# Altium footprint library DipComponent.PcbLib: 303 footprints (part 18 of 19)
Each footprint in its own frame and in the unit in brackets; x right, y up, seen from the top. Pads: shape width x height; smd on the part's side, far side on the other; paste and mask are expansions set on the pad; w line width, h text height; cw(c..) or ccw(c..) is an arc to the next point about the centre after c.
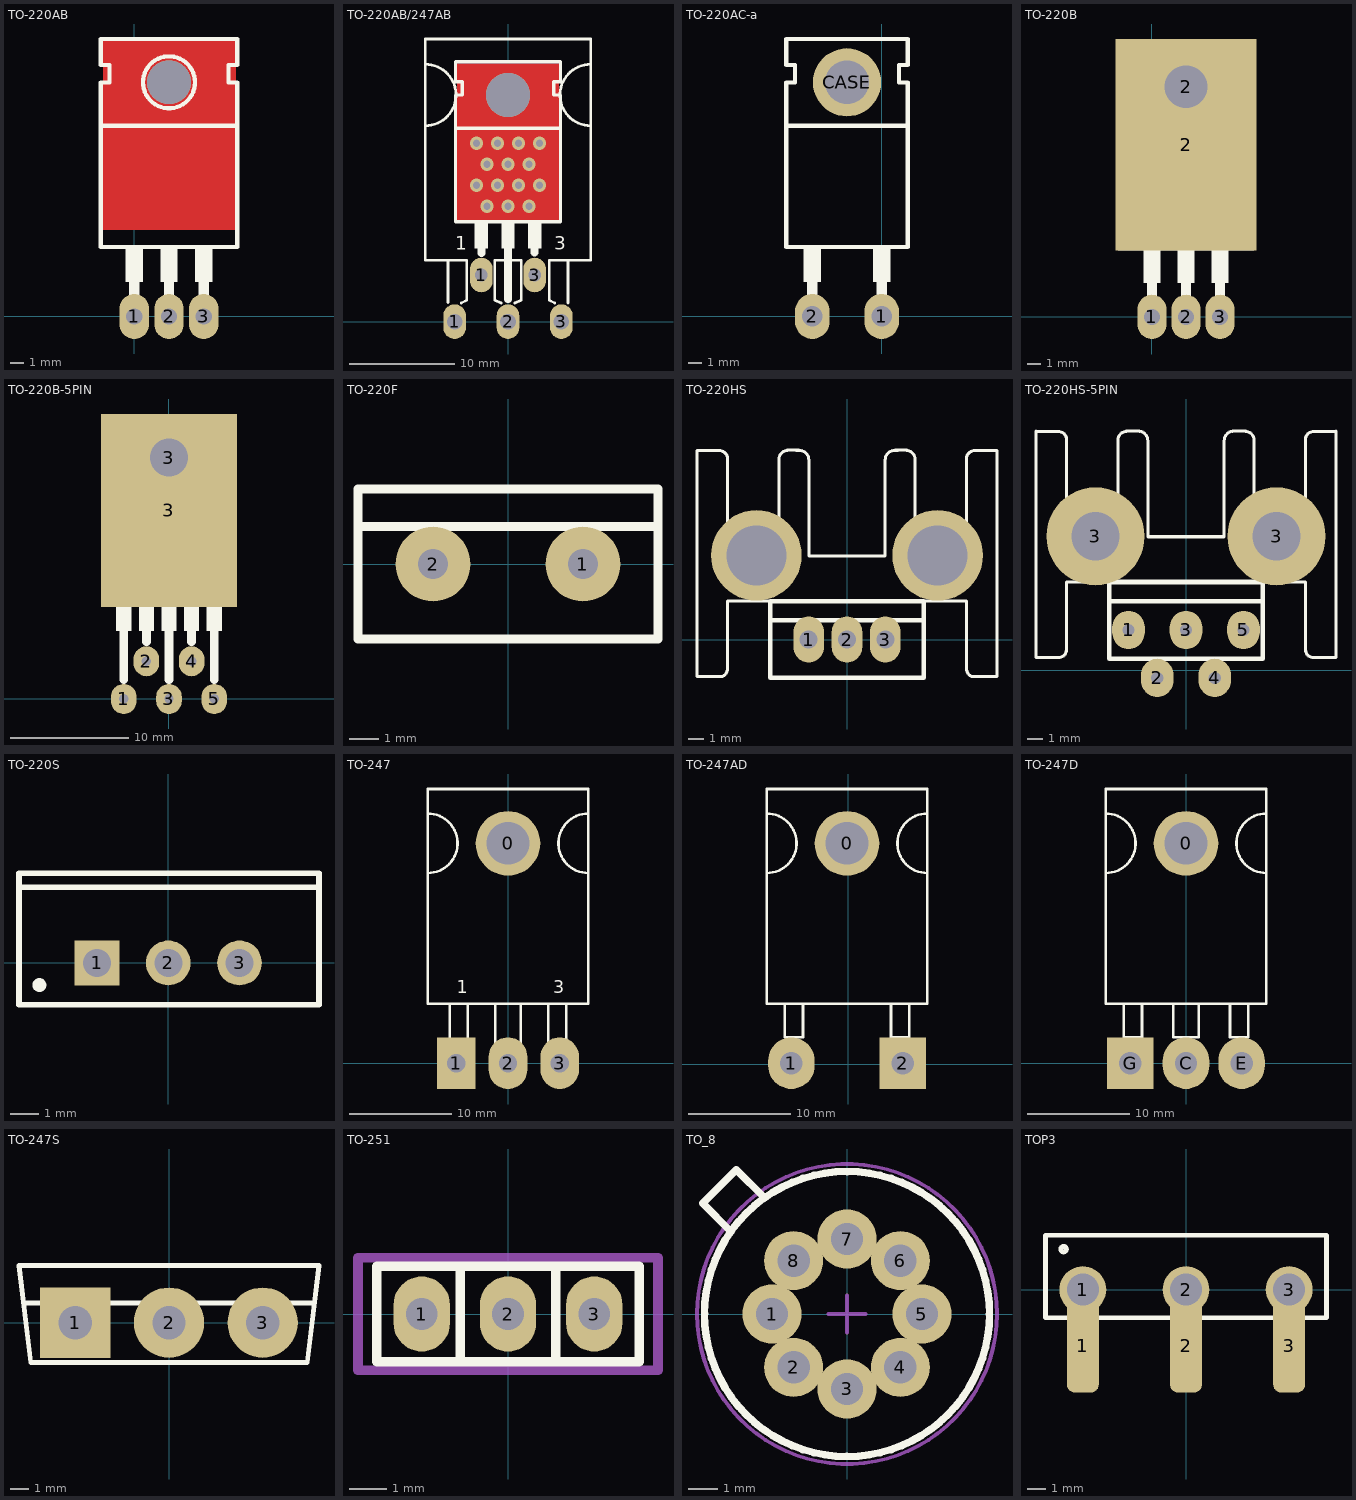
[diagram p17: the footprints below, top view; thin cyan lines are the x and y axes]

## TO-220AB [mil]
pads (3):
  oval 85x130 hole 47.24: 1(0,0) 2(100,0) 3(200,0)
via 100,675 diameter 125.98 hole 125.98
Top Layer:
  rectangle: -91,250 293,794
Top Overlay:
  circle w12: c100,675 r75
  rectangle: -25,99.97 25,199.97
  rectangle: 75,99.97 125,199.97
  rectangle: 175,99.97 225,199.97
  lines w12: -96.85,550 296.85,550 ; -96.85,800 -96.85,725 -71.85,725 -71.85,675 -96.85,675 -96.85,200 296.85,200 296.85,675 271.85,675 271.85,725 296.85,725 296.85,800
  lines w12.01: -96.85,800 296.85,800
  lines w29.53: 0,0 0,100 ; 100,0 100,100 ; 200,0 200,100
3D body "User Library-TO220-AB-H PCB.step": height 179.13, standoff -140.94, extent -95.77,-4.88 294,790.88

## TO-220AB/247AB [mil]
pads (5):
  oval 85x130 hole 59.06: 1(-200,0) 2(0,0) 3(200,0)
  oval 85x130 hole 47.24: 1(-100,175) 3(100,175)
via 0,850 diameter 165.35 hole 165.35
via 0,433.07 diameter 50 hole 28
via 78.74,433.07 diameter 50 hole 28
via -78.74,433.07 diameter 50 hole 28
via 118.11,511.81 diameter 50 hole 28
via 39.37,511.81 diameter 50 hole 28
via -39.37,511.81 diameter 50 hole 28
via -118.11,511.81 diameter 50 hole 28
via 78.74,590.55 diameter 50 hole 28
via 0,590.55 diameter 50 hole 28
via -78.74,590.55 diameter 50 hole 28
via 118.11,669.29 diameter 50 hole 28
via 39.37,669.29 diameter 50 hole 28
via -39.37,669.29 diameter 50 hole 28
via -118.11,669.29 diameter 50 hole 28
Top Layer:
  rectangle: -191,381 191,969
Bottom Layer:
  rectangle: -191,381 191,969
Top Overlay:
  circle w12: c0,850 r75
  rectangle: 75,274.97 125,374.97
  rectangle: -25,274.97 25,374.97
  rectangle: -125,274.97 -75,374.97
  lines w10: -310,735 ccw(c-310,850) -310,965 ; -225,72 -225,230 ; -175,70 -155,80 -155,230 -225,230 ; -25,70 -50,80 -50,230 50,230 50,80 25,70 ; 175,70 155,80 155,230 310,230 310,1060 -310,1060 -310,230 -225,230 ; 225,70 225,230 ; 310,735 cw(c310,850) 310,965
  lines w12: -196.85,725 196.85,725 ; -196.85,975 -196.85,900 -171.85,900 -171.85,850 -196.85,850 -196.85,375 196.85,375 196.85,850 171.85,850 171.85,900 196.85,900 196.85,975
  lines w12.01: -196.85,975 196.85,975
  lines w29.53: -100,257 -100,275 ; 0,84 0,275 ; 100,259 100,275
  text "3" at 174,270 h50
  text "1" at -198,270 h50
3D body "TO-247_bent_leads.step": height 212.6, standoff -259.84, extent -313,-1.14 312.98,1061.14

## TO-220AC-a [mm]
pads (3):
  oval 2.54x3.302 hole 1.5: 1(0,0) 2(-5.08,0)
  round 5 hole 3.2: CASE(-2.54,17.145)
Top Overlay:
  circle w0.305: c-2.54,17.145 r1.905
  rectangle: -5.715,2.54 -4.445,5.08
  rectangle: -0.635,2.54 0.635,5.08
  lines w0.305: -6.985,13.97 1.905,13.97 ; -6.985,5.08 1.905,5.08 1.905,17.145 1.27,17.145 1.27,18.415 1.905,18.415 1.905,20.32 -6.985,20.32 -6.985,18.415 -6.35,18.415 -6.35,17.145 -6.985,17.145 -6.985,5.08
  lines w0.75: -5.08,0 -5.08,2.54 ; 0,0 0,2.54

## TO-220B [mil]
height 53.15
pads (5):
  oval 85x130 hole 47.24: 1(0,0) 2(100,0) 3(200,0)
  rect 415x620 smd: 2(100,505)
  round 196.85 hole 125.98: 2(100,675)
Top Overlay:
  circle w12: c100,675 r75
  rectangle: 175,100 225,200
  rectangle: 75,100 125,200
  rectangle: -25,100 25,200
  lines w12: -96.85,550 296.85,550 ; -96.85,800 -96.85,725 -71.85,725 -71.85,675 -96.85,675 -96.85,200 296.85,200 296.85,675 271.85,675 271.85,725 296.85,725 296.85,800
  lines w12.01: -96.85,800 296.85,800
  lines w29.53: 0,0 0,100 ; 100,0 100,100 ; 200,0 200,100

## TO-220B-5PIN [mm]
pads (7):
  oval 2.159x2.54 hole 0.8: 1(-3.804,0.005) 2(-1.899,3.18) 3(0.006,0.005) 4(1.911,3.18) 5(3.816,0.005)
  rect 11.43x16.256 smd: 3(0.006,15.88)
  round 5 hole 3.2: 3(0.006,20.325)
Top Overlay:
  circle w0.305: c0.006,20.325 r1.905
  rectangle: -2.534,5.72 -1.264,8.26
  rectangle: -0.629,5.72 0.641,8.26
  rectangle: 1.276,5.72 2.546,8.26
  rectangle: -4.439,5.72 -3.169,8.26
  rectangle: 3.181,5.72 4.451,8.26
  lines w0.305: -4.439,17.15 4.451,17.15 ; -4.439,8.26 4.451,8.26 4.451,20.325 3.816,20.325 3.816,21.595 4.451,21.595 4.451,23.5 -4.439,23.5 -4.439,21.595 -3.804,21.595 -3.804,20.325 -4.439,20.325 -4.439,8.26
  lines w0.75: -3.804,1.656 -3.804,5.72 ; -1.899,4.831 -1.899,5.72 ; 0.006,1.656 0.006,5.72 ; 1.911,4.831 1.911,5.72 ; 3.816,1.656 3.816,5.72

## TO-220F [mm]
pads (2):
  round 2.54 hole 1: 1(2.54,0) 2(-2.54,0)
Top Overlay:
  lines w0.305: -5.08,1.27 5.08,1.27 ; -5.08,-2.54 -5.08,2.54 5.08,2.54 5.08,-2.54 -5.08,-2.54

## TO-220HS [mm]
pads (5):
  oval 2.032x3.048 hole 1.2: 1(-2.54,0) 2(0,0) 3(2.54,0)
  round 6 hole 4: ""(-6,5.57) ""(6,5.57)
Top Overlay:
  lines w0.203: -9.94,12.52 -8.46,12.52 cw(c-8.46,11.97) -7.91,11.97 -7.91,7.54 ; -9.94,12.54 -9.94,-2.46 -8.42,-2.46 ccw(c-8.42,-1.97) -7.93,-1.97 -7.93,2.54 0.06,2.54 ; -7.91,7.55 ccw(c-7.51,7.55) -7.51,7.15 -7.23,7.15 cw(c-7.23,6.86) -6.94,6.86 cw(c-7.28,6.86) -7.28,6.52 ; -7.349,6.521 ccw(c-6.2,5.59) -5.051,6.521 ; -5.16,6.53 -5.07,6.53 ; -5.13,6.52 cw(c-5.13,6.86) -5.47,6.86 cw(c-5.18,6.86) -5.18,7.15 -4.9,7.15 ccw(c-4.9,7.55) -4.5,7.55 ; -4.5,7.54 -4.5,11.97 cw(c-3.95,11.97) -3.95,12.52 ; -3.96,12.55 -3.18,12.55 ; -3.37,12.54 -3.17,12.54 cw(c-3.17,11.9) -2.53,11.9 -2.53,5.54 ; -2.52,5.54 0.06,5.54 ; -0.06,2.54 7.93,2.54 7.93,-1.97 ccw(c8.42,-1.97) 8.42,-2.46 9.94,-2.46 9.94,12.54 ; -0.06,5.54 2.53,5.54 2.53,11.9 cw(c3.17,11.9) 3.17,12.54 3.37,12.54 ; 3.18,12.55 3.96,12.55 ; 3.95,12.52 cw(c3.95,11.97) 4.5,11.97 4.5,7.54 ; 4.5,7.55 ccw(c4.9,7.55) 4.9,7.15 5.18,7.15 cw(c5.18,6.86) 5.47,6.86 cw(c5.13,6.86) 5.13,6.52 ; 5.031,6.511 ccw(c6.21,5.59) 7.373,6.532 ; 5.03,6.53 5.21,6.53 ; 7.21,6.54 7.37,6.54 ; 7.28,6.52 cw(c7.28,6.86) 6.94,6.86 cw(c7.23,6.86) 7.23,7.15 7.51,7.15 ccw(c7.51,7.55) 7.91,7.55 ; 7.91,7.54 7.91,11.97 cw(c8.46,11.97) 8.46,12.52 9.94,12.52
  lines w0.305: -5.08,1.27 5.08,1.27 ; -5.08,-2.54 5.08,-2.54 5.08,2.54 -5.08,2.54 -5.08,-2.54

## TO-220HS-5PIN [mm]
pads (7):
  oval 2.159x2.54 hole 0.8: 1(-3.81,2.667) 2(-1.905,-0.508) 3(0,2.667) 4(1.905,-0.508) 5(3.81,2.667)
  round 6.5 hole 3.2: 3(-6,8.872) 3(6,8.872)
Top Overlay:
  lines w0.203: -9.94,15.822 -8.46,15.822 cw(c-8.46,15.272) -7.91,15.272 -7.91,10.842 ; -9.94,15.842 -9.94,0.842 -8.42,0.842 ccw(c-8.42,1.332) -7.93,1.332 -7.93,5.842 0.06,5.842 ; -7.91,10.852 ccw(c-7.51,10.852) -7.51,10.452 -7.23,10.452 cw(c-7.23,10.162) -6.94,10.162 cw(c-7.28,10.162) -7.28,9.822 ; -7.349,9.823 ccw(c-6.2,8.892) -5.051,9.823 ; -5.16,9.832 -5.07,9.832 ; -5.13,9.822 cw(c-5.13,10.162) -5.47,10.162 cw(c-5.18,10.162) -5.18,10.452 -4.9,10.452 ccw(c-4.9,10.852) -4.5,10.852 ; -4.5,10.842 -4.5,15.272 cw(c-3.95,15.272) -3.95,15.822 ; -3.96,15.852 -3.18,15.852 ; -3.37,15.842 -3.17,15.842 cw(c-3.17,15.202) -2.53,15.202 -2.53,8.842 ; -2.52,8.842 0.06,8.842 ; -0.06,5.842 7.93,5.842 7.93,1.332 ccw(c8.42,1.332) 8.42,0.842 9.94,0.842 9.94,15.842 ; -0.06,8.842 2.53,8.842 2.53,15.202 cw(c3.17,15.202) 3.17,15.842 3.37,15.842 ; 3.18,15.852 3.96,15.852 ; 3.95,15.822 cw(c3.95,15.272) 4.5,15.272 4.5,10.842 ; 4.5,10.852 ccw(c4.9,10.852) 4.9,10.452 5.18,10.452 cw(c5.18,10.162) 5.47,10.162 cw(c5.13,10.162) 5.13,9.822 ; 5.031,9.813 ccw(c6.21,8.892) 7.373,9.834 ; 5.03,9.832 5.21,9.832 ; 7.21,9.842 7.37,9.842 ; 7.28,9.822 cw(c7.28,10.162) 6.94,10.162 cw(c7.23,10.162) 7.23,10.452 7.51,10.452 ccw(c7.51,10.852) 7.91,10.852 ; 7.91,10.842 7.91,15.272 cw(c8.46,15.272) 8.46,15.822 9.94,15.822
  lines w0.305: -5.08,4.572 5.08,4.572 ; -5.08,0.762 -4.826,0.762 4.826,0.762 5.08,0.762 5.08,5.842 -5.08,5.842 -5.08,0.762

## TO-220S [mm] "TO, Thru-Hole, Vertical, Heatsink Mounted; 3 In-Line Leads; Pitch 2.54 mm"
height 19.3
pads (3):
  rect 1.6x1.6 hole 1: 1(-2.54,0)
  round 1.6 hole 1: 2(0,0) 3(2.54,0)
Top Overlay:
  circle w0.25: c-4.597,-0.787 r0.125
  lines w0.2: -5.325,2.706 5.375,2.706 ; -5.325,-1.494 -5.325,3.206 5.375,3.206 5.375,-1.494 -5.325,-1.494
Mechanical 15:
  lines w0.1: -0.5,0 0.5,0 ; 0,-0.5 0,0.5
3D body "User Library-TO220AB.step": height 21.33, standoff -8, extent -5.606,-1.495 5.607,3.195

## TO-247 [mm]
pads (4):
  round 6.35 hole 4.2: 0(0,21.59)
  rect 3.81x5.08 hole 1.8: 1(-5.08,0)
  oval 3.81x5.08 hole 1.8: 2(0,0) 3(5.08,0)
Top Overlay:
  lines w0.254: -7.874,18.669 ccw(c-7.874,21.59) -7.874,24.511 ; -5.715,5.842 -5.715,0 -4.445,0 -4.445,1.778 -3.937,2.032 -3.937,5.842 ; -1.27,5.842 -1.27,2.032 -0.635,1.778 -0.635,0 0.635,0 0.635,1.778 1.27,2.032 1.27,5.842 ; 3.937,5.842 3.937,2.032 4.445,1.778 4.445,0 5.715,0 5.715,5.842 ; 7.874,18.669 cw(c7.874,21.59) 7.874,24.511 ; -7.874,5.842 -7.874,26.924 7.874,26.924 7.874,5.842 -7.874,5.842
  text "3" at 4.42,6.858 h1.27
  text "1" at -5.029,6.858 h1.27

## TO-247AD [mil]
pads (3):
  round 250 hole 165.35: 0(-5,855)
  oval 180x200 hole 86.61: 1(-220,5)
  rect 180x200 hole 86.61: 2(210,5)
Top Overlay:
  lines w10: -315,740 ccw(c-315,855) -315,970 ; -245,235 -245,105 -175,105 -175,235 ; 165,235 165,105 235,105 235,235 ; 305,740 cw(c305,855) 305,970 ; -315,235 305,235 305,1065 -315,1065 -315,235

## TO-247D [mil]
pads (4):
  round 250 hole 165.35: 0(0,850)
  oval 180x200 hole 86.61: C(0,0) E(215,0)
  rect 180x200 hole 86.61: G(-215,0)
Top Overlay:
  lines w10: -310,735 ccw(c-310,850) -310,965 ; -240,230 -240,100 -170,100 -170,230 ; -50,230 -50,100 50,100 50,230 ; 170,230 170,100 240,100 240,230 ; 310,735 cw(c310,850) 310,965 ; -310,230 -310,1060 310,1060 310,230 -310,230

## TO-247S [mm]
pads (3):
  rect 3.81x3.81 hole 1.8: 1(-5.08,0)
  round 3.81 hole 1.8: 2(0,0) 3(5.08,0)
Top Overlay:
  lines w0.254: -7.885,1.068 7.887,1.068 ; -8.13,3.1 -7.495,-2.16 7.495,-2.16 8.13,3.1 -8.13,3.1

## TO-251 [mm]
pads (3):
  oval 1.5x2 hole 0.85: 1(-2.3,0) 2(0,0) 3(2.3,0)
Top Overlay:
  lines w0.254: -1.27,-1.27 -1.27,1.27 ; 1.27,-1.27 1.27,1.27 ; -3.5,-1.27 3.5,-1.27 3.5,1.27 -3.5,1.27 -3.5,-1.27
Mechanical 15:
  lines w0.254: -4,-1.5 -4,1.5 4,1.5 4,-1.5 -4,-1.5
3D body "TO-251AA(IPak).step": height 9.46, standoff -3.92, extent -3.3,-0.9 3.3,1.4

## TO_8 [mm]
pads (8):
  round 2 hole 1.1: 1(-2.54,0) 2(-1.806,-1.806) 3(0,-2.54) 4(1.806,-1.806) 5(2.54,0) 6(1.806,1.806) 7(0,2.54) 8(-1.806,1.806)
Top Overlay:
  circle w0.254: c0,0 r4.826
  lines w0.254: -3.937,2.794 -4.889,3.746 -3.746,4.889 -2.794,3.937
Mechanical 15:
  circle w0.127: c0,0 r5.08
  lines w0.127: -0.635,0 0.635,0 ; 0,-0.635 0,0.635
3D body: height 4.7, standoff 0, extent 0,-4.064 4.064,0
3D body: height 4.7, standoff 0, extent -4.064,-4.064 0,0
3D body: height 4.7, standoff 0, extent -4.064,0 0,4.064
3D body: height 4.7, standoff 0, extent 0,0 4.064,4.064
3D body: height 0.89, standoff 0, extent 0,-4.699 4.699,0
3D body: height 0.89, standoff 0, extent 0,0 4.699,4.699
3D body: height 0.89, standoff 0, extent -4.699,0 0,4.699
3D body: height 0.89, standoff 0, extent -4.699,-4.699 0,0

## TOP3 [mm] "for BTA41"
pads (6):
  rrect50% 1.7x5 smd: 1(-5.5,-3) 2(0,-3) 3(5.5,-3)
  round 2.5 hole 1.7: 1(-5.5,0) 2(0,0) 3(5.5,0)
Top Overlay:
  circle w0.254: c-6.528,2.159 r0.148
  lines w0.254: -7.5,-1.5 7.5,-1.5 7.5,2.9 -7.5,2.9 -7.5,-1.5
3D body "TOP3.step": height 22.9, standoff -13, extent -7.75,-1.448 7.75,3.052